# Altium footprint library PCB1.PcbLib: 47 footprints (part 2 of 3)
Each footprint in its own frame and in the unit in brackets; x right, y up, seen from the top. Pads: shape width x height; smd on the part's side, far side on the other; paste and mask are expansions set on the pad; w line width, h text height; cw(c..) or ccw(c..) is an arc to the next point about the centre after c.
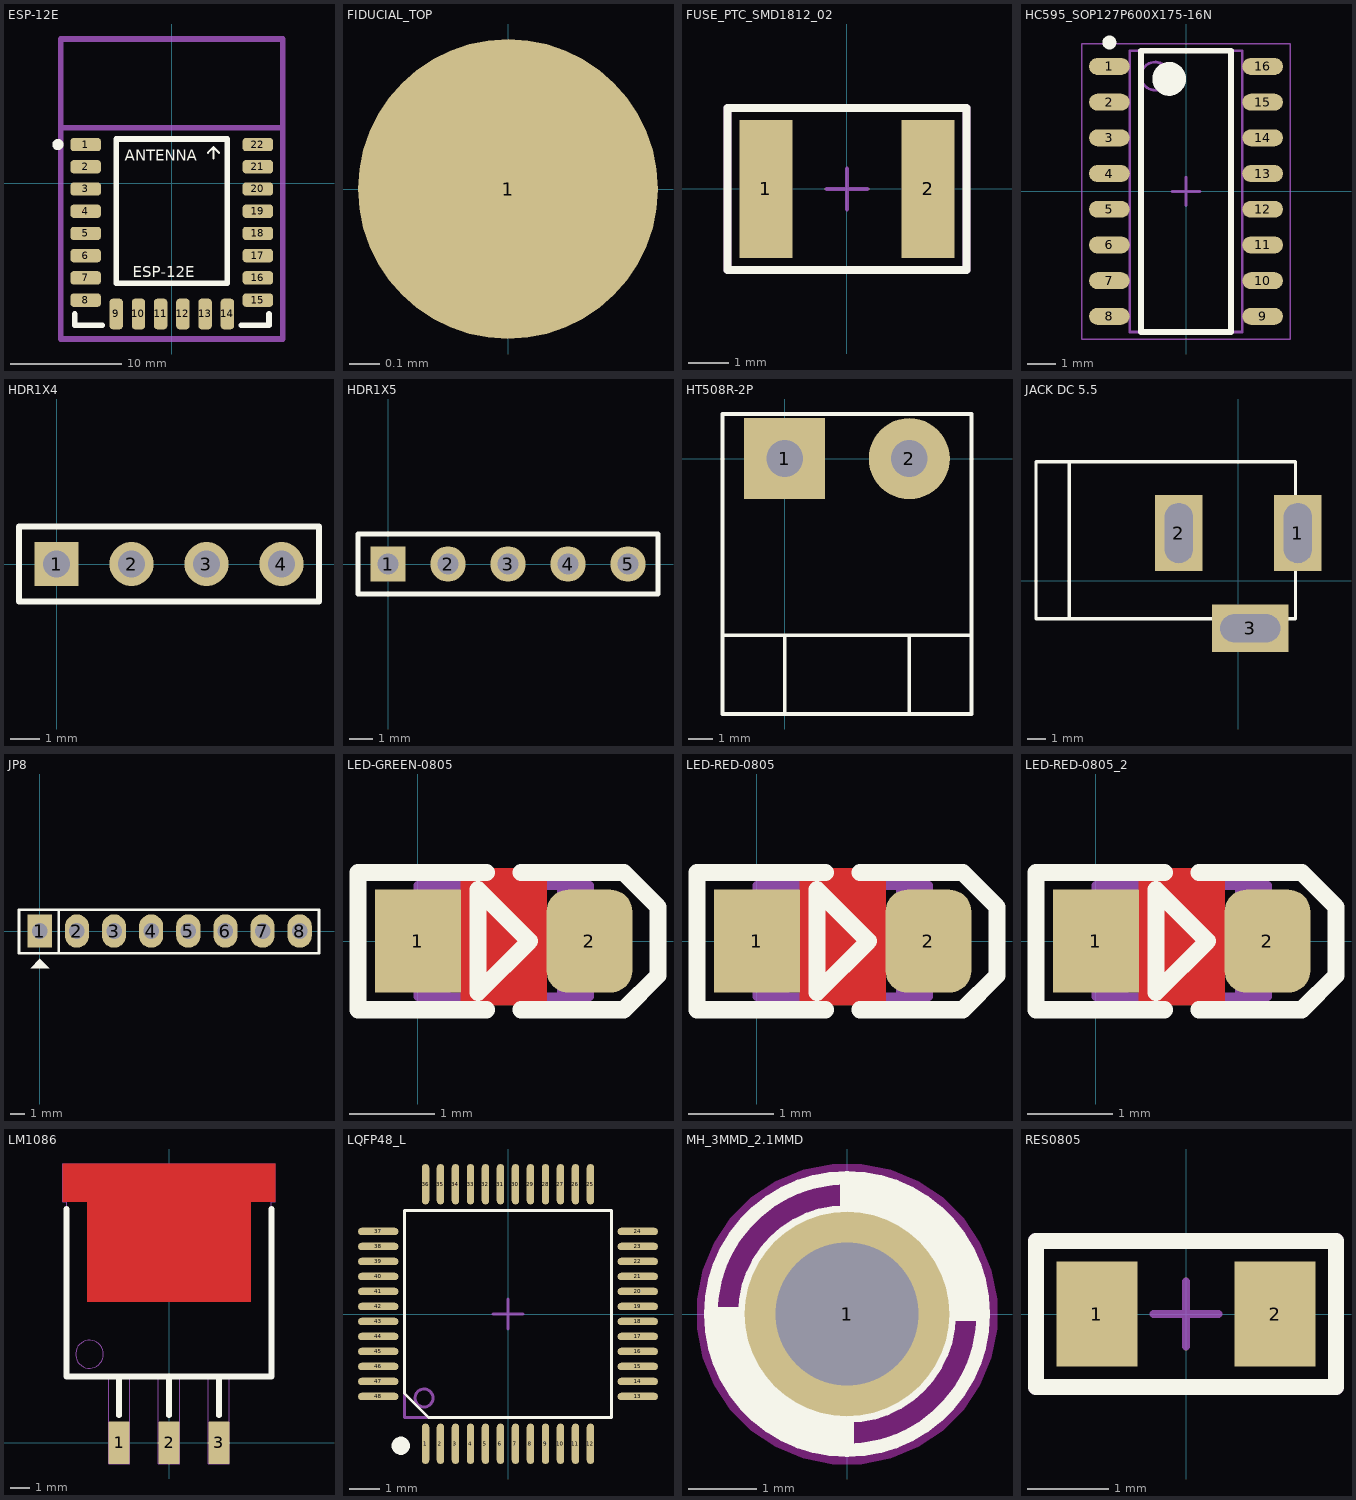
[diagram p1: the footprints below, top view; thin cyan lines are the x and y axes]

## ESP-12E [mm]
pads (22):
  rrect50% 2.75x1.2 smd: 1(-7.75,3.5) 2(-7.75,1.5) 3(-7.75,-0.5) 4(-7.75,-2.5) 5(-7.75,-4.5) 6(-7.75,-6.5) 7(-7.75,-8.5) 8(-7.75,-10.5) 15(7.75,-10.5) 16(7.75,-8.5) 17(7.75,-6.5) 18(7.75,-4.5) 19(7.75,-2.5) 20(7.75,-0.5) 21(7.75,1.5) 22(7.75,3.5)
  rrect50% 1.2x2.75 smd: 9(-5,-11.75) 10(-3,-11.75) 11(-1,-11.75) 12(1,-11.75) 13(3,-11.75) 14(5,-11.75)
Top Overlay:
  circle w0.5: c-10.25,3.5 r0.25
  lines w0.2: 3.25,2.75 3.75,3.25 ; 3.75,2.25 3.75,3.25 ; 4.25,2.75 3.75,3.25
  lines w0.5: -8.75,-11.75 -8.75,-12.75 -6.25,-12.75 ; 6.25,-12.75 8.75,-12.75 8.75,-11.75 ; -5,-9 -5,4 5,4 5,-9 -5,-9
  text "ESP-12E" at -3.532,-8.45 h1
  text "ANTENNA" at -4.25,2.05 h1
Mechanical 13:
  circle w0.5: c-7.75,3.5 r0.25
  lines w0.5: -10,5 10,5 ; -10,-14 0,-14 10,-14 10,13 -10,13 -10,-14
  text "'.Designator'" at -5.815,-0.9 h1
  text "ANTENNA / KEEP-OUT" at -5.948,6.911 h1.5
3D body "ESP-12E.step": height 2.66, standoff -0.02, extent -8.005,-12.005 8.005,12

## FIDUCIAL_TOP [mm] "1mm"
pads (1):
  round 1 smd mask+1: 1(0,0)

## FUSE_PTC_SMD1812_02 [mm]
pads (2):
  rect 1.3x3.4 smd: 1(-2,0) 2(2,0)
Top Overlay:
  lines w0.2: -2.95,-2 2.95,-2 2.95,2 -2.95,2 -2.95,-2
Mechanical 13:
  lines w0.2: -2.95,-2 2.95,-2 2.95,2 -2.95,2 -2.95,-2
  text "'.Designator'" at -2.4,-0.5 h1.2
Mechanical 15:
  lines w0.1: -0.5,0 0.5,0 ; 0,-0.5 0,0.5
3D body "User Library-0ZCG-0_70mm.step": height 0.91, standoff 0.01, extent -2.25,-1.6 2.25,1.6

## HC595_SOP127P600X175-16N [mm] "SOP, 16-Leads, Body 9.90x3.90mm, Pitch 1.27mm, IPC Medium Density"
height 1.75
pads (16):
  oval 1.45x0.6 smd: 1(-2.725,4.445) 2(-2.725,3.175) 3(-2.725,1.905) 4(-2.725,0.635) 5(-2.725,-0.635) 6(-2.725,-1.905) 7(-2.725,-3.175) 8(-2.725,-4.445) 9(2.725,-4.445) 10(2.725,-3.175) 11(2.725,-1.905) 12(2.725,-0.635) 13(2.725,0.635) 14(2.725,1.905) 15(2.725,3.175) 16(2.725,4.445)
Top Overlay:
  circle w0.25: c-2.725,5.295 r0.125
  circle w0.6: c-0.6,4 r0.3
  lines w0.2: -1.6,-5 -1.6,5 1.6,5 1.6,-5 -1.6,-5
Mechanical 13:
  circle w0.1: c-1.1,4.1 r0.5
  lines w0.1: -2,-5 -2,5 2,5 2,-5 -2,-5
Mechanical 15:
  lines w0.05: -3.7,-5.25 -3.7,5.25 3.7,5.25 3.7,-5.25 -3.7,-5.25
  lines w0.1: -0.5,0 0.5,0 ; 0,-0.5 0,0.5
3D body "SOP127P600X175-16N.step": height 1.75, standoff 0, extent -3,-5 3,5

## HDR1X4 [mm] "Connector; Header; 4 Position"
height 2.54
pads (4):
  rect 1.5x1.5 hole 0.9: 1(0,0)
  round 1.5 hole 0.9: 2(2.54,0) 3(5.08,0) 4(7.62,0)
Top Overlay:
  lines w0.2: -1.27,-1.27 -1.27,1.27 8.89,1.27 8.89,-1.27 -1.27,-1.27
3D body: height 7, standoff -1, extent 4.674,-0.406 5.47,0.392
3D body: height 7, standoff -1, extent -0.406,-0.406 0.39,0.392
3D body: height 7, standoff -1, extent 2.134,-0.406 2.93,0.392
3D body: height 7, standoff -1, extent 7.214,-0.406 8.011,0.392
3D body: height 1.5, standoff 0, extent 1.27,-1.27 3.81,1.27
3D body: height 1.5, standoff 0, extent -1.27,-1.27 1.27,1.27
3D body: height 1.5, standoff 0, extent 6.35,-1.27 8.89,1.27
3D body: height 1.5, standoff 0, extent 3.81,-1.27 6.35,1.27

## HDR1X5 [mm] "Connector; Header; 5 Position"
height 2.54
pads (5):
  rect 1.5x1.5 hole 0.9: 1(0,0)
  round 1.5 hole 0.9: 2(2.54,0) 3(5.08,0) 4(7.62,0) 5(10.16,0)
Top Overlay:
  lines w0.2: -1.27,-1.27 11.43,-1.27 11.43,1.27 -1.27,1.27 -1.27,-1.27
3D body: height 7, standoff -1, extent 4.674,-0.406 5.471,0.392
3D body: height 7, standoff -1, extent 9.754,-0.406 10.551,0.392
3D body: height 7, standoff -1, extent 7.214,-0.406 8.011,0.392
3D body: height 7, standoff -1, extent 2.134,-0.406 2.931,0.392
3D body: height 7, standoff -1, extent -0.406,-0.406 0.391,0.392
3D body: height 1.5, standoff 0, extent 6.35,-1.27 8.89,1.27
3D body: height 1.5, standoff 0, extent 3.81,-1.27 6.35,1.27
3D body: height 1.5, standoff 0, extent 8.89,-1.27 11.43,1.27
3D body: height 1.5, standoff 0, extent -1.27,-1.27 1.27,1.27
3D body: height 1.5, standoff 0, extent 1.27,-1.27 3.81,1.27

## HT508R-2P [mil]
pads (2):
  rect 130x130 hole 59.06: 1(0,0)
  round 130 hole 59.06: 2(200,0)
Top Overlay:
  lines w6: -100,-283.46 300,-283.46 ; 0,-409.84 0,-283.46 ; 200,-409.84 200,-283.46 ; -100,-409.84 -100,71.65 300,71.65 300,-409.84 -100,-409.84
3D body "SW3dPS-5EHDR_2P.STEP": height 333.51, standoff -157.48, extent -96.85,-403 296.85,69.44

## JACK DC 5.5 [mm] "Jac DC input"
height 5.08
pads (3):
  rect 2.54x4.064 hole 1.5 slot 3.2 at 90 deg: 1(3.175,2.54) 2(-3.175,2.54)
  rect 4.064x2.54 hole 1.5 slot 3.2 at 0 deg: 3(0.635,-2.54)
Top Overlay:
  lines w0.178: -9.017,-2.032 -9.017,6.35 ; -10.795,-2.032 -10.795,6.35 3.048,6.35 3.048,-2.032 -10.795,-2.032
3D body "SW3dPS-dc range - dc connector[4840.2201].STEP": height 11.02, standoff -3.48, extent -10.423,-2.67 3.404,6.836

## JP8 [mil] "JP8"
height 200
pads (8):
  rect 65x90 hole 42: 1(0,0)
  oval 65x90 hole 42: 2(100,0) 3(200,0) 4(300,0) 5(400,0) 6(500,0) 7(600,0) 8(700,0)
Top Overlay:
  region: 0,-75 -25,-100 25,-100
  lines w7: 51,-60 51,56 ; -56,-60 -56,57 752,57 752,-60 -56,-60
3D body "JP1-8.stp": height 323.43, standoff -117.51, extent -48.03,-50 748.03,48.43

## LED-GREEN-0805 [mm] "GREEN"
pads (2):
  rect 1x1.2 smd mask+0.075: 1(0,0)
  rrect50% 1x1.2 smd mask+0.075: 2(2,0)
Top Layer:
  pour cut-out: 0.5,0.85 1.5,0.85 1.5,-0.75 0.5,-0.75
Top Overlay:
  lines w0.2: 0.8,-0.8 -0.7,-0.8 -0.7,0.8 0.8,0.8 ; 1.2,-0.8 2.4,-0.8 2.8,-0.4 2.8,0.4 2.4,0.8 1.2,0.8 ; 0.7,-0.6 1.3,0 0.7,0.6 0.7,-0.6
Mechanical 1:
  text "'.Designator'" at 0.254,0.762 h1.52
Mechanical 13:
  region: 1.995,-0.192 1.842,-0.192 1.842,-0.651 1.995,-0.651
  rectangle: 0.005,-0.649 0.158,-0.19
  region: 1.848,0.65 1.619,0.65 1.619,-0.65 1.848,-0.65
  region: 1.995,0.649 1.842,0.649 1.842,0.189 1.995,0.189
  rectangle: 0.152,-0.65 0.381,0.65
  rectangle: 0.005,0.191 0.158,0.651
  lines w0.102: 0.695,0.356 0.924,0.025 0.67,0 0.924,-0.33 ; 1.102,0.356 1.33,0.025 1.076,0 1.33,-0.33 ; 0.924,-0.33 0.924,-0.178 0.771,-0.279 0.924,-0.33 ; 1.33,-0.33 1.178,-0.279 1.33,-0.178 1.33,-0.33 ; 0,-0.65 2,-0.65 2,-0.19 cw(c2,0) 2,0.191 2,0.65 0,0.65 0,0.191 cw(c0,0) 0,-0.191 0,-0.65
3D body "User Library-Wurth Elektronik WL-SMCW 0805 (2012) LED Lens (Separate Body).step": height 0.7, standoff 0.3, extent 0.3,-0.625 1.7,0.625
3D body "User Library-Wurth Elektronik WL-SMCW 0805 (2012) LED Base (Separate Lens).step": height 0.64, standoff 0, extent 0,-0.625 2,0.625

## LED-RED-0805 [mm]
pads (2):
  rect 1x1.2 smd mask+0.075: 1(0,0)
  rrect50% 1x1.2 smd mask+0.075: 2(2,0)
Top Layer:
  pour cut-out: 0.5,0.85 1.5,0.85 1.5,-0.75 0.5,-0.75
Top Overlay:
  lines w0.2: 0.8,-0.8 -0.7,-0.8 -0.7,0.8 0.8,0.8 ; 1.2,-0.8 2.4,-0.8 2.8,-0.4 2.8,0.4 2.4,0.8 1.2,0.8 ; 0.7,-0.6 0.7,0.6 1.3,0 0.7,-0.6
Mechanical 1:
  text "'.Designator'" at 0.254,0.762 h1.52
Mechanical 13:
  rectangle: 0.005,-0.649 0.158,-0.189
  rectangle: 0.005,0.192 0.158,0.651
  rectangle: 0.152,-0.65 0.381,0.65
  region: 1.995,-0.192 1.842,-0.192 1.842,-0.651 1.995,-0.651
  region: 1.848,0.65 1.619,0.65 1.619,-0.65 1.848,-0.65
  region: 1.995,0.649 1.842,0.649 1.842,0.189 1.995,0.189
  lines w0.102: 0.695,0.356 0.924,0.025 0.67,0 0.924,-0.33 ; 1.102,0.356 1.33,0.025 1.076,0 1.33,-0.33 ; 0.924,-0.33 0.771,-0.279 0.924,-0.178 0.924,-0.33 ; 1.33,-0.33 1.33,-0.178 1.178,-0.279 1.33,-0.33 ; 0,-0.65 0,-0.191 ccw(c0,0) 0,0.191 0,0.65 2,0.65 2,0.191 ccw(c2,0) 2,-0.191 2,-0.65 0,-0.65
3D body "User Library-Wurth Elektronik WL-SMCW 0805 (2012) LED Lens (Separate Body).step": height 0.7, standoff 0.3, extent 0.3,-0.625 1.7,0.625
3D body "User Library-Wurth Elektronik WL-SMCW 0805 (2012) LED Base (Separate Lens).step": height 0.64, standoff 0, extent 0,-0.625 2,0.625

## LED-RED-0805_2 [mm]
pads (2):
  rect 1x1.2 smd mask+0.075: 1(0,0)
  rrect50% 1x1.2 smd mask+0.075: 2(2,0)
Top Layer:
  pour cut-out: 0.5,0.85 1.5,0.85 1.5,-0.75 0.5,-0.75
Top Overlay:
  lines w0.2: 0.8,-0.8 -0.7,-0.8 -0.7,0.8 0.8,0.8 ; 1.2,-0.8 2.4,-0.8 2.8,-0.4 2.8,0.4 2.4,0.8 1.2,0.8 ; 0.7,-0.6 0.7,0.6 1.3,0 0.7,-0.6
Mechanical 1:
  text "'.Designator'" at 0.254,0.762 h1.52
Mechanical 13:
  rectangle: 0.152,-0.65 0.381,0.65
  rectangle: 0.005,0.192 0.158,0.651
  rectangle: 0.005,-0.649 0.158,-0.189
  region: 1.848,0.65 1.619,0.65 1.619,-0.65 1.848,-0.65
  region: 1.995,0.649 1.842,0.649 1.842,0.189 1.995,0.189
  region: 1.995,-0.192 1.842,-0.192 1.842,-0.651 1.995,-0.651
  lines w0.102: 0.695,0.356 0.924,0.025 0.67,0 0.924,-0.33 ; 1.102,0.356 1.33,0.025 1.076,0 1.33,-0.33 ; 0.924,-0.33 0.924,-0.178 0.771,-0.279 0.924,-0.33 ; 1.33,-0.33 1.33,-0.178 1.178,-0.279 1.33,-0.33 ; 0,-0.65 2,-0.65 2,-0.19 cw(c2,0) 2,0.191 2,0.65 0,0.65 0,0.191 cw(c0,0) 0,-0.191 0,-0.65
3D body "User Library-Wurth Elektronik WL-SMCW 0805 (2012) LED Lens (Separate Body).step": height 0.7, standoff 0.3, extent 0.3,-0.625 1.7,0.625
3D body "User Library-Wurth Elektronik WL-SMCW 0805 (2012) LED Base (Separate Lens).step": height 0.64, standoff 0, extent 0,-0.625 2,0.625

## LM1086 [mm] "TO-263 1.5A Low Dropout Positive Regulators"
height 4.64
pads (4):
  rrect10% 1.07x2.16 smd mask+0.1: 1(-2.54,0) 2(0,0) 3(2.54,0)
  round 0.025 smd: 4(0,10.675)
Top Layer:
  region: -5.4,14.17 5.4,14.17 5.4,12.26 4.165,12.26 4.165,7.18 -4.165,7.18 -4.165,12.26 -5.4,12.26
Top Overlay:
  lines w0.3: -5.205,11.875 -5.205,3.37 5.205,3.37 5.205,11.875 ; -2.54,1.4 -2.54,3.37 ; 0,1.4 0,3.37 ; 2.54,1.4 2.54,3.37
Mechanical 1:
  circle w0.05: c-4.04,4.5 r0.707
  lines w0.05: -5.19,12.26 -5.4,12.26 -5.4,14.17 5.4,14.17 5.4,12.26 5.205,12.26 ; -5.205,3.37 -5.205,13.53 5.205,13.53 5.205,3.37 -5.205,3.37 ; -3.075,-1.08 -2.005,-1.08 -2.005,3.37 -3.075,3.37 -3.075,-1.08 ; -0.535,-1.08 -0.535,3.37 0.535,3.37 0.535,-1.08 -0.535,-1.08 ; 2.005,-1.08 2.005,3.37 3.075,3.37 3.075,-1.08 2.005,-1.08
  text "OUT" at 0.5,3.8 h1
  text "GND" at -2.1,3.8 h1
  text "IN" at 3,3.8 h1
3D body "SW3dPS-TO263-3S.STEP": height 4.78, standoff -0.02, extent -5,-1.152 5,14.518

## LQFP48_L [mm] "Thin QFP, 48-Leads, Body 7x7mm, Pitch 0.5mm, IPC High Density-stm32f103c8t6"
height 1.6
pads (48):
  oval 0.25x1.35 smd: 1(-2.75,-4.325) 2(-2.25,-4.325) 3(-1.75,-4.325) 4(-1.25,-4.325) 5(-0.75,-4.325) 6(-0.25,-4.325) 7(0.25,-4.325) 8(0.75,-4.325) 9(1.25,-4.325) 10(1.75,-4.325) 11(2.25,-4.325) 12(2.75,-4.325) 25(2.75,4.325) 26(2.25,4.325) 27(1.75,4.325) 28(1.25,4.325) 29(0.75,4.325) 30(0.25,4.325) 31(-0.25,4.325) 32(-0.75,4.325) 33(-1.25,4.325) 34(-1.75,4.325) 35(-2.25,4.325) 36(-2.75,4.325)
  oval 1.35x0.25 smd: 13(4.325,-2.75) 14(4.325,-2.25) 15(4.325,-1.75) 16(4.325,-1.25) 17(4.325,-0.75) 18(4.325,-0.25) 19(4.325,0.25) 20(4.325,0.75) 21(4.325,1.25) 22(4.325,1.75) 23(4.325,2.25) 24(4.325,2.75) 37(-4.325,2.75) 38(-4.325,2.25) 39(-4.325,1.75) 40(-4.325,1.25) 41(-4.325,0.75) 42(-4.325,0.25) 43(-4.325,-0.25) 44(-4.325,-0.75) 45(-4.325,-1.25) 46(-4.325,-1.75) 47(-4.325,-2.25) 48(-4.325,-2.75)
Top Overlay:
  region: -3.273,-4.39 -3.273,-4.449 -3.319,-4.56 -3.403,-4.644 -3.513,-4.69 -3.573,-4.69 -3.633,-4.69 -3.743,-4.644 -3.827,-4.56 -3.873,-4.449 -3.873,-4.39 -3.873,-4.33 -3.827,-4.22 -3.743,-4.135 -3.633,-4.09 -3.573,-4.09 -3.513,-4.09 -3.403,-4.135 -3.319,-4.22 -3.273,-4.33
  lines w0.1: -3.45,-2.65 -3.45,3.45 3.45,3.45 3.45,-3.45 -2.65,-3.45 -3.45,-2.65
Mechanical 1:
  text ".Designator" at 0.254,0.254 h1.52
Mechanical 13:
  circle w0.1: c-2.8,-2.8 r0.3
  lines w0.1: -3.45,-3.45 3.45,-3.45 3.45,3.45 -3.45,3.45 -3.45,-3.45
Mechanical 15:
  lines w0.1: -0.5,0 0.5,0 ; 0,-0.5 0,0.5
3D body "User Library-STM32F103C8T6.STEP": height 1.55, standoff 0, extent -4.5,-4.5 4.5,4.5

## MH_3MMD_2.1MMD [mm]
pads (1):
  round 3 hole 2.1: 1(0,0)
Top Overlay:
  region: 0,1.5 0.147,1.493 0.435,1.435 0.707,1.323 0.952,1.16 1.16,0.952 1.323,0.707 1.435,0.435 1.493,0.147 1.5,0 2,0 2,0.197 1.923,0.583 1.772,0.947 1.554,1.275 1.275,1.554 0.947,1.772 0.583,1.923 0.197,2 0,2
  region: 0,-2 -0.197,-2 -0.583,-1.923 -0.947,-1.772 -1.275,-1.554 -1.554,-1.275 -1.772,-0.947 -1.923,-0.583 -2,-0.197 -2,0 -1.5,0 -1.493,-0.147 -1.435,-0.435 -1.323,-0.707 -1.16,-0.952 -0.952,-1.16 -0.707,-1.323 -0.435,-1.435 -0.147,-1.493 0,-1.5
  lines w0.2: -2,0 cw(c0,0) 0,2 ; -2,0 ccw(c0,0) 0,-2 ; -2,0 -1.5,0 ; -1.5,0 cw(c0,0) 0,1.5 ; -1.5,0 ccw(c0,0) 0,-1.5 ; 0,-2 ccw(c0,0) 2,0 ; 0,-2 0,-1.5 ; 0,-1.5 ccw(c0,0) 1.5,0 ; 0,1.5 cw(c0,0) 1.5,0 ; 0,1.5 0,2 ; 0,2 cw(c0,0) 2,0 ; 1.5,0 2,0
Bottom Overlay:
  region: 0,1.5 0.147,1.493 0.435,1.435 0.707,1.323 0.952,1.16 1.16,0.952 1.323,0.707 1.435,0.435 1.493,0.147 1.5,0 2,0 2,0.197 1.923,0.583 1.772,0.947 1.553,1.275 1.275,1.554 0.947,1.772 0.583,1.923 0.197,2 0,2
  region: 0,-2 -0.197,-2 -0.583,-1.923 -0.947,-1.772 -1.275,-1.554 -1.554,-1.275 -1.772,-0.947 -1.923,-0.583 -2,-0.197 -2,0 -1.5,0 -1.493,-0.147 -1.435,-0.435 -1.323,-0.707 -1.16,-0.952 -0.952,-1.16 -0.707,-1.323 -0.435,-1.435 -0.147,-1.493 0,-1.5
  lines w0.2: -2,0 cw(c0,0) 0,2 ; -2,0 ccw(c0,0) 0,-2 ; -2,0 -1.5,0 ; -1.5,0 ccw(c0,0) 0,-1.5 ; -1.5,0 cw(c0,0) 0,1.5 ; 0,-2 ccw(c0,0) 2,0 ; 0,-2 0,-1.5 ; 0,-1.5 ccw(c0,0) 1.5,0 ; 0,1.5 cw(c0,0) 1.5,0 ; 0,1.5 0,2 ; 0,2 cw(c0,0) 2,0 ; 1.5,0 2,0
Keep-Out Layer:
  pour cut-out: 0,-2.2 -0.217,-2.2 -0.642,-2.115 -1.042,-1.95 -1.402,-1.709 -1.709,-1.402 -1.95,-1.042 -2.115,-0.642 -2.2,-0.217 -2.2,0 -2.2,0.217 -2.115,0.642 -1.95,1.042 -1.709,1.402 -1.402,1.709 -1.042,1.95 -0.642,2.115 -0.217,2.2 0,2.2 0.217,2.2 0.642,2.115 1.042,1.95 1.402,1.709 1.709,1.402 1.95,1.042 2.115,0.642 2.2,0.217 2.2,0 2.2,-0.217 2.115,-0.642 1.95,-1.042 1.709,-1.402 1.402,-1.709 1.042,-1.95 0.642,-2.115 0.217,-2.2

## RES0805 [mm]
pads (2):
  rect 1x1.3 smd: 1(-1.1,0) 2(1.1,0)
Top Overlay:
  lines w0.2: -1.85,-0.9 -1.85,0.9 1.85,0.9 1.85,-0.9 -1.85,-0.9
Mechanical 13:
  lines w0.2: -1.85,-0.9 1.85,-0.9 1.85,0.9 -1.85,0.9 -1.85,-0.9
  text "'.Designator'" at -1.475,-0.725 h0.8
Mechanical 15:
  lines w0.1: -0.4,0 0.4,0 ; 0,-0.4 0,0.4
3D body "User Library-RESC2012X05N.STEP": height 0.45, standoff 0, extent -0.995,-0.625 1.005,0.625